# Altium footprint library Miscellaneous THD.PcbLib: 216 footprints (part 1 of 15)
Each footprint in its own frame and in the unit in brackets; x right, y up, seen from the top. Pads: shape width x height; smd on the part's side, far side on the other; paste and mask are expansions set on the pad; w line width, h text height; cw(c..) or ccw(c..) is an arc to the next point about the centre after c.
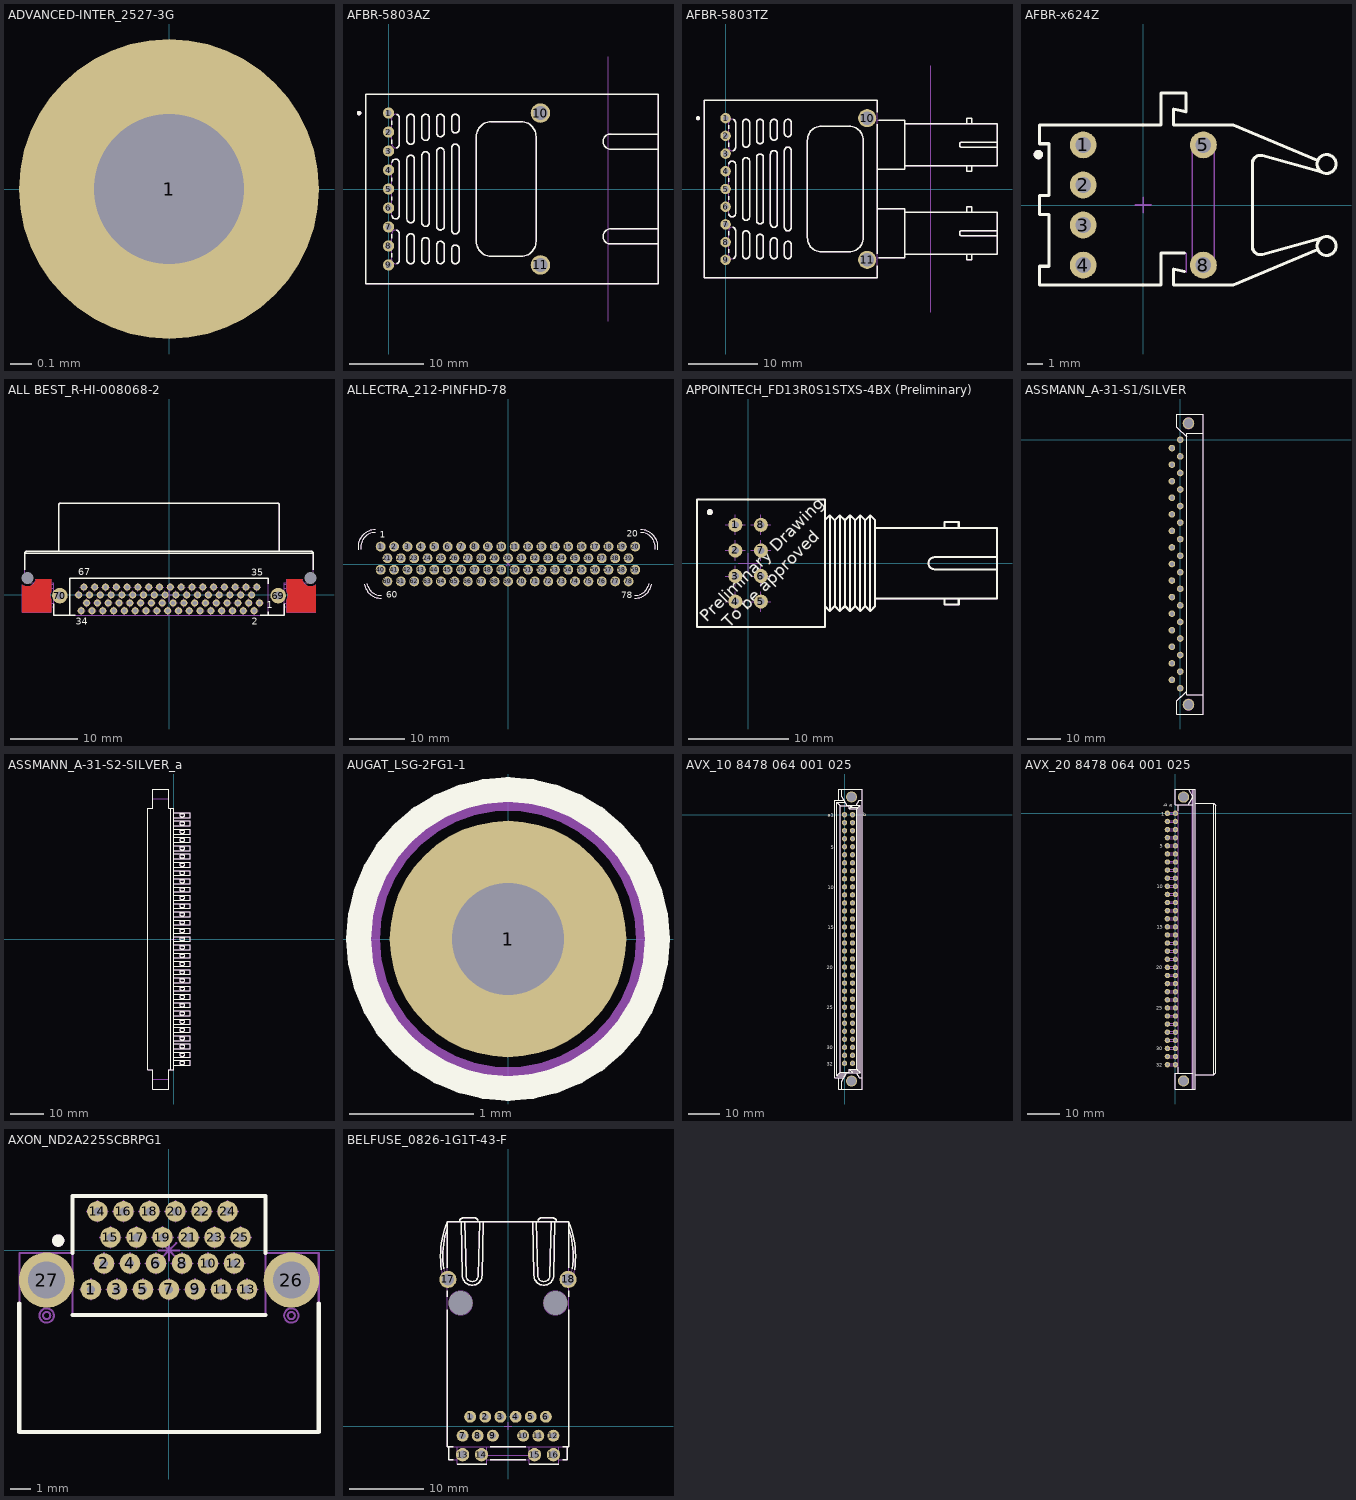
[diagram p0: the footprints below, top view; thin cyan lines are the x and y axes]

## ADVANCED-INTER_2527-3G [mm] "Single Male/Male Board Stacking Male Terminal adapter"
height 5.34
pads (1):
  round 1.4 hole 0.7: 1(0,0)
Mechanical 14:
  circle w0.1: c0,0 r0.47
  circle w0.1: c0,0 r0.23
3D body "ADVANCED-INTER_2527-2.stp": height 4.97, standoff -3.18, extent -0.47,-0.47 0.47,0.47

## AFBR-5803AZ [mm] "AFBR-5803AZ, Fiber Optic Transceiver, Through Hole Mount"
height 11.1
pads (11):
  round 1.5 hole 0.8: 1(0,10.16) 2(0,7.62) 3(0,5.08) 4(0,2.54) 5(0,0) 6(0,-2.54) 7(0,-5.08) 8(0,-7.62) 9(0,-10.16)
  round 2.6 hole 1.9: 10(20.32,10.16) 11(20.32,-10.16)
Top Overlay:
  circle w0.3: c-3.95,10.16 r0.15
  lines w0.2: 0.44,-9.152 0.44,-8.628 ; 0.44,-6.612 0.44,-6.088 ; 0.44,-1.532 0.44,-1.008 ; 0.44,1.008 0.44,1.532 ; 0.44,6.088 0.44,6.612 ; 0.44,8.628 0.44,9.152 ; 0.442,-3.547 ccw(c0.94,-3.5) 1.44,-3.5 1.44,3.5 ccw(c0.94,3.5) 0.442,3.547 ; 1.014,-5.506 cw(c0.94,-6) 1.44,-6 1.44,-9.5 cw(c0.94,-9.5) 1.085,-9.979 ; 1.014,5.506 ccw(c0.94,6) 1.44,6 1.44,9.5 ccw(c0.94,9.5) 1.085,9.979 ; 36.06,-7.35 29.77,-7.35 cw(c29.7,-6.35) 29.77,-5.35 36.06,-5.35 ; 36.06,5.35 29.77,5.35 cw(c29.7,6.35) 29.77,7.35 36.06,7.35 ; -3.06,-12.7 36.06,-12.7 36.06,12.7 -3.06,12.7 -3.06,-12.7 ; 2.44,-9.5 ccw(c2.94,-9.5) 3.44,-9.5 3.44,-6.5 ccw(c2.94,-6.5) 2.44,-6.5 2.44,-9.5 ; 2.44,-4 ccw(c2.94,-4) 3.44,-4 3.44,4 ccw(c2.94,4) 2.44,4 2.44,-4 ; 2.44,6.5 ccw(c2.94,6.5) 3.44,6.5 3.44,9.5 ccw(c2.94,9.5) 2.44,9.5 2.44,6.5 ; 4.44,-9.5 ccw(c4.94,-9.5) 5.44,-9.5 5.44,-7 ccw(c4.94,-7) 4.44,-7 4.44,-9.5 ; 4.44,-4.5 ccw(c4.94,-4.5) 5.44,-4.5 5.44,4.5 ccw(c4.94,4.5) 4.44,4.5 4.44,-4.5 ; 4.44,7 ccw(c4.94,7) 5.44,7 5.44,9.5 ccw(c4.94,9.5) 4.44,9.5 4.44,7 ; 6.44,-9.5 ccw(c6.94,-9.5) 7.44,-9.5 7.44,-7.5 ccw(c6.94,-7.5) 6.44,-7.5 6.44,-9.5 ; 6.44,-5 ccw(c6.94,-5) 7.44,-5 7.44,5 ccw(c6.94,5) 6.44,5 6.44,-5 ; 6.44,7.5 ccw(c6.94,7.5) 7.44,7.5 7.44,9.5 ccw(c6.94,9.5) 6.44,9.5 6.44,7.5 ; 8.44,-9.5 ccw(c8.94,-9.5) 9.44,-9.5 9.44,-8 ccw(c8.94,-8) 8.44,-8 8.44,-9.5 ; 8.44,-5.5 ccw(c8.94,-5.5) 9.44,-5.5 9.44,5.5 ccw(c8.94,5.5) 8.44,5.5 8.44,-5.5 ; 8.44,8 ccw(c8.94,8) 9.44,8 9.44,9.5 ccw(c8.94,9.5) 8.44,9.5 8.44,8 ; 11.74,-7 ccw(c13.74,-7) 13.74,-9 17.74,-9 ccw(c17.74,-7) 19.74,-7 19.74,7 ccw(c17.74,7) 17.74,9 13.74,9 ccw(c13.74,7) 11.74,7 11.74,-7
Mechanical 8:
  lines w0.05: -0.5,-10.16 0,-10.16 ; -0.5,-7.62 0,-7.62 ; -0.5,-5.08 0,-5.08 ; -0.5,-2.54 0,-2.54 ; -0.5,0 0,0 ; -0.5,2.54 0,2.54 ; -0.5,5.08 0,5.08 ; -0.5,7.62 0,7.62 ; -0.5,10.16 0,10.16 ; 0,-10.66 0,-10.16 ; 0,-9.66 0,-10.16 ; 0,-8.12 0,-7.62 ; 0,-7.12 0,-7.62 ; 0,-5.58 0,-5.08 ; 0,-4.58 0,-5.08 ; 0,-3.04 0,-2.54 ; 0,-2.04 0,-2.54 ; 0,-0.5 0,0 ; 0,0.5 0,0 ; 0,2.04 0,2.54 ; 0,3.04 0,2.54 ; 0,4.58 0,5.08 ; 0,5.58 0,5.08 ; 0,7.12 0,7.62 ; 0,8.12 0,7.62 ; 0,9.66 0,10.16 ; 0,10.66 0,10.16 ; 0.5,-10.16 0,-10.16 ; 0.5,-7.62 0,-7.62 ; 0.5,-5.08 0,-5.08 ; 0.5,-2.54 0,-2.54 ; 0.5,0 0,0 ; 0.5,2.54 0,2.54 ; 0.5,5.08 0,5.08 ; 0.5,7.62 0,7.62 ; 0.5,10.16 0,10.16 ; 19.82,-10.16 20.32,-10.16 ; 19.82,10.16 20.32,10.16 ; 20.32,-10.66 20.32,-10.16 ; 20.32,-9.66 20.32,-10.16 ; 20.32,9.66 20.32,10.16 ; 20.32,10.66 20.32,10.16 ; 20.82,-10.16 20.32,-10.16 ; 20.82,10.16 20.32,10.16 ; 29.41,-17.7 29.41,17.7
  text "Front Panel" at 30.021,6.184 h1.5
Mechanical 14:
  circle w0.3: c-3.95,10.16 r0.15
  lines w0.1: 36.06,-7.35 29.77,-7.35 cw(c29.7,-6.35) 29.77,-5.35 36.06,-5.35 ; 36.06,5.35 29.77,5.35 cw(c29.7,6.35) 29.77,7.35 36.06,7.35 ; -3.06,-12.7 36.06,-12.7 36.06,12.7 -3.06,12.7 -3.06,-12.7 ; 0.44,-9.5 ccw(c0.94,-9.5) 1.44,-9.5 1.44,-6 ccw(c0.94,-6) 0.44,-6 0.44,-9.5 ; 0.44,-3.5 ccw(c0.94,-3.5) 1.44,-3.5 1.44,3.5 ccw(c0.94,3.5) 0.44,3.5 0.44,-3.5 ; 0.44,6 ccw(c0.94,6) 1.44,6 1.44,9.5 ccw(c0.94,9.5) 0.44,9.5 0.44,6 ; 2.44,-9.5 ccw(c2.94,-9.5) 3.44,-9.5 3.44,-6.5 ccw(c2.94,-6.5) 2.44,-6.5 2.44,-9.5 ; 2.44,-4 ccw(c2.94,-4) 3.44,-4 3.44,4 ccw(c2.94,4) 2.44,4 2.44,-4 ; 2.44,6.5 ccw(c2.94,6.5) 3.44,6.5 3.44,9.5 ccw(c2.94,9.5) 2.44,9.5 2.44,6.5 ; 4.44,-9.5 ccw(c4.94,-9.5) 5.44,-9.5 5.44,-7 ccw(c4.94,-7) 4.44,-7 4.44,-9.5 ; 4.44,-4.5 ccw(c4.94,-4.5) 5.44,-4.5 5.44,4.5 ccw(c4.94,4.5) 4.44,4.5 4.44,-4.5 ; 4.44,7 ccw(c4.94,7) 5.44,7 5.44,9.5 ccw(c4.94,9.5) 4.44,9.5 4.44,7 ; 6.44,-9.5 ccw(c6.94,-9.5) 7.44,-9.5 7.44,-7.5 ccw(c6.94,-7.5) 6.44,-7.5 6.44,-9.5 ; 6.44,-5 ccw(c6.94,-5) 7.44,-5 7.44,5 ccw(c6.94,5) 6.44,5 6.44,-5 ; 6.44,7.5 ccw(c6.94,7.5) 7.44,7.5 7.44,9.5 ccw(c6.94,9.5) 6.44,9.5 6.44,7.5 ; 8.44,-9.5 ccw(c8.94,-9.5) 9.44,-9.5 9.44,-8 ccw(c8.94,-8) 8.44,-8 8.44,-9.5 ; 8.44,-5.5 ccw(c8.94,-5.5) 9.44,-5.5 9.44,5.5 ccw(c8.94,5.5) 8.44,5.5 8.44,-5.5 ; 8.44,8 ccw(c8.94,8) 9.44,8 9.44,9.5 ccw(c8.94,9.5) 8.44,9.5 8.44,8 ; 11.74,-7 ccw(c13.74,-7) 13.74,-9 17.74,-9 ccw(c17.74,-7) 19.74,-7 19.74,7 ccw(c17.74,7) 17.74,9 13.74,9 ccw(c13.74,7) 11.74,7 11.74,-7
3D body "AFBR-5803AZ.stp": height 11.35, standoff -3.6, extent -3.06,-12.7 36.06,12.7

## AFBR-5803TZ [mm] "AFBR-5803TZ, Fiber Optic Transceiver, Through Hole Mount"
height 12
pads (11):
  round 1.5 hole 0.8: 1(0,10.16) 2(0,7.62) 3(0,5.08) 4(0,2.54) 5(0,0) 6(0,-2.54) 7(0,-5.08) 8(0,-7.62) 9(0,-10.16)
  round 2.6 hole 1.9: 10(20.32,10.16) 11(20.32,-10.16)
Top Overlay:
  circle w0.3: c-3.95,10.16 r0.15
  lines w0.2: 0.44,-9.152 0.44,-8.628 ; 0.44,-6.612 0.44,-6.088 ; 0.44,-1.532 0.44,-1.008 ; 0.44,1.008 0.44,1.532 ; 0.44,6.088 0.44,6.612 ; 0.44,8.628 0.44,9.152 ; 0.442,-3.547 ccw(c0.94,-3.5) 1.44,-3.5 1.44,3.5 ccw(c0.94,3.5) 0.442,3.547 ; 1.014,-5.506 cw(c0.94,-6) 1.44,-6 1.44,-9.5 cw(c0.94,-9.5) 1.085,-9.979 ; 1.014,5.506 ccw(c0.94,6) 1.44,6 1.44,9.5 ccw(c0.94,9.5) 1.085,9.979 ; 21.74,-11 21.74,-12.7 -3.06,-12.7 -3.06,12.7 21.74,12.7 21.74,11 ; 21.74,-9.32 21.74,9.32 ; 21.74,-2.85 25.74,-2.85 25.74,-9.85 21.941,-9.85 ; 21.74,2.85 25.74,2.85 25.74,9.85 21.941,9.85 ; 25.74,-9.35 38.94,-9.35 38.94,-3.35 25.74,-3.35 ; 25.74,3.35 38.94,3.35 38.94,9.35 25.74,9.35 ; 34.565,-9.35 34.565,-10.16 35.315,-10.16 35.315,-9.35 ; 34.565,-3.35 34.565,-2.54 35.315,-2.54 35.315,-3.35 ; 34.565,3.35 34.565,2.54 35.315,2.54 35.315,3.35 ; 34.565,9.35 34.565,10.16 35.315,10.16 35.315,9.35 ; 38.94,-6.725 33.94,-6.725 cw(c33.94,-6.35) 33.94,-5.975 38.94,-5.975 ; 38.94,5.975 33.94,5.975 cw(c33.94,6.35) 33.94,6.725 38.94,6.725 ; 2.44,-9.5 ccw(c2.94,-9.5) 3.44,-9.5 3.44,-6.5 ccw(c2.94,-6.5) 2.44,-6.5 2.44,-9.5 ; 2.44,-4 ccw(c2.94,-4) 3.44,-4 3.44,4 ccw(c2.94,4) 2.44,4 2.44,-4 ; 2.44,6.5 ccw(c2.94,6.5) 3.44,6.5 3.44,9.5 ccw(c2.94,9.5) 2.44,9.5 2.44,6.5 ; 4.44,-9.5 ccw(c4.94,-9.5) 5.44,-9.5 5.44,-7 ccw(c4.94,-7) 4.44,-7 4.44,-9.5 ; 4.44,-4.5 ccw(c4.94,-4.5) 5.44,-4.5 5.44,4.5 ccw(c4.94,4.5) 4.44,4.5 4.44,-4.5 ; 4.44,7 ccw(c4.94,7) 5.44,7 5.44,9.5 ccw(c4.94,9.5) 4.44,9.5 4.44,7 ; 6.44,-9.5 ccw(c6.94,-9.5) 7.44,-9.5 7.44,-7.5 ccw(c6.94,-7.5) 6.44,-7.5 6.44,-9.5 ; 6.44,-5 ccw(c6.94,-5) 7.44,-5 7.44,5 ccw(c6.94,5) 6.44,5 6.44,-5 ; 6.44,7.5 ccw(c6.94,7.5) 7.44,7.5 7.44,9.5 ccw(c6.94,9.5) 6.44,9.5 6.44,7.5 ; 8.44,-9.5 ccw(c8.94,-9.5) 9.44,-9.5 9.44,-8 ccw(c8.94,-8) 8.44,-8 8.44,-9.5 ; 8.44,-5.5 ccw(c8.94,-5.5) 9.44,-5.5 9.44,5.5 ccw(c8.94,5.5) 8.44,5.5 8.44,-5.5 ; 8.44,8 ccw(c8.94,8) 9.44,8 9.44,9.5 ccw(c8.94,9.5) 8.44,9.5 8.44,8 ; 11.74,-7 ccw(c13.74,-7) 13.74,-9 17.74,-9 ccw(c17.74,-7) 19.74,-7 19.74,7 ccw(c17.74,7) 17.74,9 13.74,9 ccw(c13.74,7) 11.74,7 11.74,-7
Mechanical 8:
  lines w0.05: -0.5,-10.16 0,-10.16 ; -0.5,-7.62 0,-7.62 ; -0.5,-5.08 0,-5.08 ; -0.5,-2.54 0,-2.54 ; -0.5,0 0,0 ; -0.5,2.54 0,2.54 ; -0.5,5.08 0,5.08 ; -0.5,7.62 0,7.62 ; -0.5,10.16 0,10.16 ; 0,-10.66 0,-10.16 ; 0,-9.66 0,-10.16 ; 0,-8.12 0,-7.62 ; 0,-7.12 0,-7.62 ; 0,-5.58 0,-5.08 ; 0,-4.58 0,-5.08 ; 0,-3.04 0,-2.54 ; 0,-2.04 0,-2.54 ; 0,-0.5 0,0 ; 0,0.5 0,0 ; 0,2.04 0,2.54 ; 0,3.04 0,2.54 ; 0,4.58 0,5.08 ; 0,5.58 0,5.08 ; 0,7.12 0,7.62 ; 0,8.12 0,7.62 ; 0,9.66 0,10.16 ; 0,10.66 0,10.16 ; 0.5,-10.16 0,-10.16 ; 0.5,-7.62 0,-7.62 ; 0.5,-5.08 0,-5.08 ; 0.5,-2.54 0,-2.54 ; 0.5,0 0,0 ; 0.5,2.54 0,2.54 ; 0.5,5.08 0,5.08 ; 0.5,7.62 0,7.62 ; 0.5,10.16 0,10.16 ; 19.82,-10.16 20.32,-10.16 ; 19.82,10.16 20.32,10.16 ; 20.32,-10.66 20.32,-10.16 ; 20.32,-9.66 20.32,-10.16 ; 20.32,9.66 20.32,10.16 ; 20.32,10.66 20.32,10.16 ; 20.82,-10.16 20.32,-10.16 ; 20.82,10.16 20.32,10.16 ; 29.41,-17.7 29.41,17.7
  text "Front Panel" at 30.021,6.184 h1.5
Mechanical 14:
  circle w0.3: c-3.95,10.16 r0.15
  lines w0.1: 21.74,-9.85 25.74,-9.85 25.74,-2.85 21.74,-2.85 ; 21.74,2.85 25.74,2.85 25.74,9.85 21.74,9.85 ; 25.74,-9.35 38.94,-9.35 38.94,-3.35 25.74,-3.35 ; 25.74,3.35 38.94,3.35 38.94,9.35 25.74,9.35 ; 34.565,-9.35 34.565,-10.16 35.315,-10.16 35.315,-9.35 ; 34.565,-3.35 34.565,-2.54 35.315,-2.54 35.315,-3.35 ; 34.565,3.35 34.565,2.54 35.315,2.54 35.315,3.35 ; 34.565,9.35 34.565,10.16 35.315,10.16 35.315,9.35 ; 38.94,-6.725 33.94,-6.725 cw(c33.94,-6.35) 33.94,-5.975 38.94,-5.975 ; 38.94,5.975 33.94,5.975 cw(c33.94,6.35) 33.94,6.725 38.94,6.725 ; -3.06,-12.7 -3.06,12.7 21.74,12.7 21.74,-12.7 -3.06,-12.7 ; 0.44,-9.5 ccw(c0.94,-9.5) 1.44,-9.5 1.44,-6 ccw(c0.94,-6) 0.44,-6 0.44,-9.5 ; 0.44,-3.5 ccw(c0.94,-3.5) 1.44,-3.5 1.44,3.5 ccw(c0.94,3.5) 0.44,3.5 0.44,-3.5 ; 0.44,6 ccw(c0.94,6) 1.44,6 1.44,9.5 ccw(c0.94,9.5) 0.44,9.5 0.44,6 ; 2.44,-9.5 ccw(c2.94,-9.5) 3.44,-9.5 3.44,-6.5 ccw(c2.94,-6.5) 2.44,-6.5 2.44,-9.5 ; 2.44,-4 ccw(c2.94,-4) 3.44,-4 3.44,4 ccw(c2.94,4) 2.44,4 2.44,-4 ; 2.44,6.5 ccw(c2.94,6.5) 3.44,6.5 3.44,9.5 ccw(c2.94,9.5) 2.44,9.5 2.44,6.5 ; 4.44,-9.5 ccw(c4.94,-9.5) 5.44,-9.5 5.44,-7 ccw(c4.94,-7) 4.44,-7 4.44,-9.5 ; 4.44,-4.5 ccw(c4.94,-4.5) 5.44,-4.5 5.44,4.5 ccw(c4.94,4.5) 4.44,4.5 4.44,-4.5 ; 4.44,7 ccw(c4.94,7) 5.44,7 5.44,9.5 ccw(c4.94,9.5) 4.44,9.5 4.44,7 ; 6.44,-9.5 ccw(c6.94,-9.5) 7.44,-9.5 7.44,-7.5 ccw(c6.94,-7.5) 6.44,-7.5 6.44,-9.5 ; 6.44,-5 ccw(c6.94,-5) 7.44,-5 7.44,5 ccw(c6.94,5) 6.44,5 6.44,-5 ; 6.44,7.5 ccw(c6.94,7.5) 7.44,7.5 7.44,9.5 ccw(c6.94,9.5) 6.44,9.5 6.44,7.5 ; 8.44,-9.5 ccw(c8.94,-9.5) 9.44,-9.5 9.44,-8 ccw(c8.94,-8) 8.44,-8 8.44,-9.5 ; 8.44,-5.5 ccw(c8.94,-5.5) 9.44,-5.5 9.44,5.5 ccw(c8.94,5.5) 8.44,5.5 8.44,-5.5 ; 8.44,8 ccw(c8.94,8) 9.44,8 9.44,9.5 ccw(c8.94,9.5) 8.44,9.5 8.44,8 ; 11.74,-7 ccw(c13.74,-7) 13.74,-9 17.74,-9 ccw(c17.74,-7) 19.74,-7 19.74,7 ccw(c17.74,7) 17.74,9 13.74,9 ccw(c13.74,7) 11.74,7 11.74,-7
3D body "AFBR-5803TZ.stp": height 12.25, standoff -3.6, extent -3.06,-12.7 38.94,12.7

## AFBR-x624Z [mm] "AFBR-x624Z, Fiber Optic Receiver, Through Hole Mount"
height 7.62
pads (6):
  round 1.7 hole 1: 1(-3.81,3.81) 2(-3.81,1.27) 3(-3.81,-1.27) 4(-3.81,-3.81) 5(3.81,3.81) 8(3.81,-3.81)
Top Overlay:
  circle w0.3: c-6.65,3.2 r0.15
  circle w0.2: c11.62,2.6 r0.6
  circle w0.2: c11.62,-2.6 r0.6
  lines w0.2: 2.6,-4.222 1.92,-4.065 1.92,-5.08 5.72,-5.08 11.067,-2.833 cw(c11.62,-2.6) 11.311,-2.086 7.554,-3.129 cw(c7.42,-2.647) 6.923,-2.7 6.923,2.7 cw(c7.42,2.647) 7.554,3.129 11.311,2.086 cw(c11.62,2.6) 11.067,2.833 5.72,5.08 1.92,5.08 1.92,6.095 2.72,5.91 2.72,7.11 1.12,7.11 1.12,5.08 -6.58,5.08 -6.58,3.88 -5.98,3.88 -5.98,0.6 -6.58,0.6 -6.58,-0.6 -5.98,-0.6 -5.98,-3.88 -6.58,-3.88 -6.58,-5.08 1.12,-5.08 1.12,-3.05 2.6,-3.05
Mechanical 8:
  lines w0.1: -4.31,-3.81 -3.81,-3.81 ; -4.31,-1.27 -3.81,-1.27 ; -4.31,1.27 -3.81,1.27 ; -4.31,3.81 -3.81,3.81 ; -3.81,-4.31 -3.81,-3.81 ; -3.81,-3.31 -3.81,-3.81 ; -3.81,-1.77 -3.81,-1.27 ; -3.81,-0.77 -3.81,-1.27 ; -3.81,0.77 -3.81,1.27 ; -3.81,1.77 -3.81,1.27 ; -3.81,3.31 -3.81,3.81 ; -3.81,4.31 -3.81,3.81 ; -3.31,-3.81 -3.81,-3.81 ; -3.31,-1.27 -3.81,-1.27 ; -3.31,1.27 -3.81,1.27 ; -3.31,3.81 -3.81,3.81 ; -0.5,0 0,0 ; 0,-0.5 0,0 ; 0,0.5 0,0 ; 0.5,0 0,0 ; 3.31,-3.81 3.81,-3.81 ; 3.31,3.81 3.81,3.81 ; 3.81,-4.31 3.81,-3.81 ; 3.81,-3.31 3.81,-3.81 ; 3.81,3.31 3.81,3.81 ; 3.81,4.31 3.81,3.81 ; 4.31,-3.81 3.81,-3.81 ; 4.31,3.81 3.81,3.81
Mechanical 14:
  circle w0.3: c-6.65,3.2 r0.15
  circle w0.1: c11.62,-2.6 r0.6
  circle w0.1: c11.62,2.6 r0.6
  lines w0.1: -6.58,-5.08 1.12,-5.08 1.12,-3.05 2.72,-3.05 2.72,-4.25 1.92,-4.065 1.92,-5.08 5.72,-5.08 11.067,-2.833 cw(c11.62,-2.6) 11.311,-2.086 7.554,-3.129 cw(c7.42,-2.647) 6.923,-2.7 6.923,2.7 cw(c7.42,2.647) 7.554,3.129 11.311,2.086 cw(c11.62,2.6) 11.067,2.833 5.72,5.08 1.92,5.08 1.92,6.095 2.72,5.91 2.72,7.11 1.12,7.11 1.12,5.08 -6.58,5.08 -6.58,3.88 -5.98,3.88 -5.98,0.6 -6.58,0.6 -6.58,-0.6 -5.98,-0.6 -5.98,-3.88 -6.58,-3.88 -6.58,-5.08 ; 3.11,-3.81 ccw(c3.81,-3.81) 4.51,-3.81 4.51,3.81 ccw(c3.81,3.81) 3.11,3.81 3.11,-3.81
3D body "AFBR-x624Z.stp": height 7.66, standoff -4, extent -6.58,-5.08 12.22,7.11

## ALL BEST_R-HI-008068-2 [mm] "68 Positions, Pitch 0.8mm, Very Hight Density Right Angle Plug, VHDCI Standard"
height 6
pads (72):
  round 1.05 hole 0.65: 1(13.4,-1.2) 2(12.6,-2.35) 3(11.8,-1.2) 4(11,-2.35) 5(10.2,-1.2) 6(9.4,-2.35) 7(8.6,-1.2) 8(7.8,-2.35) 9(7,-1.2) 10(6.2,-2.35) 11(5.4,-1.2) 12(4.6,-2.35) 13(3.8,-1.2) 14(3,-2.35) 15(2.2,-1.2) 16(1.4,-2.35) 17(0.6,-1.2) 18(-0.2,-2.35) 19(-1,-1.2) 20(-1.8,-2.35) 21(-2.6,-1.2) 22(-3.4,-2.35) 23(-4.2,-1.2) 24(-5,-2.35) 25(-5.8,-1.2) 26(-6.6,-2.35) 27(-7.4,-1.2) 28(-8.2,-2.35) 29(-9,-1.2) 30(-9.8,-2.35) 31(-10.6,-1.2) 32(-11.4,-2.35) 33(-12.2,-1.2) 34(-13,-2.35) 35(13,1.15) 36(12.225,0) 37(11.4,1.15) 38(10.625,0) 39(9.8,1.15) 40(9.025,0) 41(8.2,1.15) 42(7.425,0) 43(6.6,1.15) 44(5.825,0) 45(5,1.15) 46(4.225,0) 47(3.4,1.15) 48(2.625,0) 49(1.8,1.15) 50(1.025,0) 51(0.2,1.15) 52(-0.575,0) 53(-1.4,1.15) 54(-2.175,0) 55(-3,1.15) 56(-3.775,0) 57(-4.6,1.15) 58(-5.375,0) 59(-6.2,1.15) 60(-6.975,0) 61(-7.8,1.15) 62(-8.575,0) 63(-9.4,1.15) 64(-10.175,0) 65(-11,1.15) 66(-11.775,0) 67(-12.6,1.15) 68(-13.375,0)
  round 2.3 hole 1.2: 69(16.17,-0.105) 70(-16.17,-0.105)
  round 1 hole 1.8 unplated mask+0.4: 71(20.95,2.51) 72(-20.95,2.51)
Top Layer:
  region: -17.42,-2.557 -17.42,-0.757 -17.489,-0.603 -17.57,-0.274 -17.57,0.064 -17.489,0.393 -17.42,0.547 -17.42,2.347 -19.701,2.347 -19.733,2.185 -19.858,1.881 -20.059,1.619 -20.321,1.419 -20.625,1.293 -20.952,1.25 -21.279,1.294 -21.583,1.421 -21.72,1.513 -21.72,-2.557
  region: 17.42,-2.557 17.42,-0.757 17.489,-0.603 17.57,-0.274 17.57,0.064 17.489,0.393 17.42,0.547 17.42,2.347 19.701,2.347 19.733,2.185 19.858,1.881 20.059,1.619 20.321,1.419 20.625,1.293 20.952,1.25 21.279,1.294 21.583,1.421 21.72,1.513 21.72,-2.557
Top Overlay:
  lines w0.2: -21.35,6.144 21.35,6.144 ; -21.349,3.705 -21.348,6.144 cw(c-21.048,6.144) -21.048,6.444 21.05,6.444 cw(c21.05,6.144) 21.35,6.144 ; -17.1,-1.314 -17.1,-3.005 -13.875,-3.005 ; -16.347,6.444 -16.347,13.294 cw(c-16.047,13.294) -16.047,13.594 16.049,13.594 cw(c16.049,13.294) 16.349,13.294 16.349,6.444 ; -14.7,-3.005 -14.7,2.435 14.7,2.435 14.7,1.625 ; 13.5,-3.005 17.1,-3.005 ; 14.7,-3.005 14.7,-2.5 ; 15.555,-3.005 17.1,-3.005 ; 17.1,-1.314 17.1,-3.005 ; 21.35,3.705 21.35,6.144
  text "1" at 14.496,-1.974 h1
  text "35" at 12.2,2.862 h1
  text "67" at -13.464,2.936 h1
  text "34" at -13.8,-4.446 h1
  text "2" at 12.275,-4.446 h1
Top Solder:
  region: 17.293,-2.684 21.847,-2.684 21.847,1.818 21.772,1.73 21.596,1.579 21.394,1.468 21.173,1.399 20.943,1.377 20.713,1.402 20.493,1.473 20.292,1.588 20.119,1.74 19.98,1.925 19.881,2.134 19.827,2.359 19.818,2.474 17.293,2.474 17.293,0.515 17.362,0.369 17.443,0.056 17.443,-0.266 17.362,-0.579 17.293,-0.725
  region: -21.847,-2.684 -17.293,-2.684 -17.293,-0.725 -17.362,-0.579 -17.443,-0.266 -17.443,0.056 -17.362,0.369 -17.293,0.515 -17.293,2.474 -19.818,2.474 -19.827,2.359 -19.881,2.134 -19.98,1.925 -20.119,1.74 -20.292,1.588 -20.493,1.473 -20.713,1.402 -20.943,1.377 -21.173,1.399 -21.394,1.468 -21.596,1.579 -21.772,1.73 -21.847,1.818
Mechanical 8:
  drawing of 614 lines, arcs and shapes, not listed
Mechanical 14:
  lines w0.1: -21.35,6.144 21.35,6.144 ; -17.1,-1.755 -19.275,-1.755 cw(c-19.275,-1.255) -19.775,-1.255 -19.775,1.045 cw(c-19.275,1.045) -19.275,1.545 -17.1,1.545 ; -17.1,-1.205 -19.075,-1.205 cw(c-19.075,-1.005) -19.275,-1.005 -19.275,0.795 cw(c-19.075,0.795) -19.075,0.995 -17.1,0.995 ; -16.347,6.444 -16.347,13.294 cw(c-16.047,13.294) -16.047,13.594 16.049,13.594 cw(c16.049,13.294) 16.349,13.294 16.349,6.444 ; -14.7,-3.005 -14.7,2.435 14.7,2.435 14.7,-3.005 17.1,-3.005 ; 17.1,-1.755 19.275,-1.755 ccw(c19.275,-1.255) 19.775,-1.255 19.775,1.045 ccw(c19.275,1.045) 19.275,1.545 17.1,1.545 ; 17.1,-1.205 19.075,-1.205 ccw(c19.075,-1.005) 19.275,-1.005 19.275,0.795 ccw(c19.075,0.795) 19.075,0.995 17.1,0.995 ; 17.1,-3.005 -17.1,-3.005 -17.1,1.81 -21.35,1.81 -21.348,6.144 cw(c-21.048,6.144) -21.048,6.444 21.05,6.444 cw(c21.05,6.144) 21.35,6.144 ; 17.1,-3.005 17.1,1.81 21.35,1.81 21.35,6.144
  text "1" at 14.496,-1.974 h1
  text "35" at 12.2,2.862 h1
  text "67" at -13.464,2.936 h1
  text "34" at -13.8,-4.446 h1
  text "2" at 12.275,-4.446 h1
3D body "ALL BEST_R-HI-008068-2.stp": height 6, standoff -3.7, extent -21.35,-3.005 21.35,13.594

## ALLECTRA_212-PINFHD-78 [mm] "78 Crimp Pins for High Desnity 78 Pins Sub-D Female Connector"
height 7.31
pads (78):
  round 1.78 / inner round 1.78 / far side round 2.05 hole 1.25: 1(-22.9,3.12) 2(-20.49,3.12) 3(-18.08,3.12) 4(-15.67,3.12) 5(-13.26,3.12) 6(-10.85,3.12) 7(-8.44,3.12) 8(-6.03,3.12) 9(-3.62,3.12) 10(-1.21,3.12) 11(1.2,3.12) 12(3.61,3.12) 13(6.02,3.12) 14(8.43,3.12) 15(10.84,3.12) 16(13.25,3.12) 17(15.66,3.12) 18(18.07,3.12) 19(20.48,3.12) 20(22.89,3.12) 21(-21.69,1.04) 22(-19.28,1.04) 23(-16.87,1.04) 24(-14.46,1.04) 25(-12.05,1.04) 26(-9.64,1.04) 27(-7.23,1.04) 28(-4.82,1.04) 29(-2.41,1.04) 30(0,1.04) 31(2.41,1.04) 32(4.82,1.04) 33(7.23,1.04) 34(9.64,1.04) 35(12.05,1.04) 36(14.46,1.04) 37(16.87,1.04) 38(19.28,1.04) 39(21.69,1.04) 40(-22.9,-1.04) 41(-20.49,-1.04) 42(-18.08,-1.04) 43(-15.67,-1.04) 44(-13.26,-1.04) 45(-10.85,-1.04) 46(-8.44,-1.04) 47(-6.03,-1.04) 48(-3.62,-1.04) 49(-1.21,-1.04) 50(1.2,-1.04) 51(3.61,-1.04) 52(6.02,-1.04) 53(8.43,-1.04) 54(10.84,-1.04) 55(13.25,-1.04) 56(15.66,-1.04) 57(18.07,-1.04) 58(20.48,-1.04) 59(22.89,-1.04) 60(-21.69,-3.12) 61(-19.28,-3.12) 62(-16.87,-3.12) 63(-14.46,-3.12) 64(-12.05,-3.12) 65(-9.64,-3.12) 66(-7.23,-3.12) 67(-4.82,-3.12) 68(-2.41,-3.12) 69(0,-3.12) 70(2.41,-3.12) 71(4.82,-3.12) 72(7.23,-3.12) 73(9.64,-3.12) 74(12.05,-3.12) 75(14.46,-3.12) 76(16.87,-3.12) 77(19.28,-3.12) 78(21.69,-3.12)
Top Overlay:
  lines w0.2: -26.933,2.522 cw(c-23.88,3.06) -23.88,6.16 ; -26.441,2.609 cw(c-23.88,3.06) -23.88,5.66 ; -25.854,-3.598 ccw(c-22.801,-3.06) -22.801,-6.16 ; -25.361,-3.511 ccw(c-22.801,-3.06) -22.801,-5.66 ; 22.801,-6.16 ccw(c22.801,-3.06) 25.854,-3.598 ; 22.801,-5.66 ccw(c22.801,-3.06) 25.361,-3.511 ; 23.88,5.66 cw(c23.88,3.06) 26.441,2.609 ; 23.88,6.16 cw(c23.88,3.06) 26.933,2.522
  text "20" at 21.386,4.896 h1.2
  text "78" at 20.346,-6.139 h1.2
  text "1" at -23.032,4.764 h1.2
  text "60" at -21.907,-6.032 h1.2
Mechanical 8:
  drawing of 316 lines, arcs and shapes, not listed
  text "pin female orgenized as male pinout" at -20.14,4.764 h1.2
Mechanical 14:
  circle w0.1: c-22.9,3.12 r0.35
  circle w0.1: c-21.69,1.04 r0.35
  circle w0.1: c-22.9,-1.04 r0.35
  circle w0.1: c-21.69,-3.12 r0.35
  circle w0.1: c-20.49,3.12 r0.35
  circle w0.1: c-19.28,1.04 r0.35
  circle w0.1: c-20.49,-1.04 r0.35
  circle w0.1: c-19.28,-3.12 r0.35
  circle w0.1: c-18.08,3.12 r0.35
  circle w0.1: c-16.87,1.04 r0.35
  circle w0.1: c-18.08,-1.04 r0.35
  circle w0.1: c-16.87,-3.12 r0.35
  circle w0.1: c-15.67,3.12 r0.35
  circle w0.1: c-14.46,1.04 r0.35
  circle w0.1: c-15.67,-1.04 r0.35
  circle w0.1: c-14.46,-3.12 r0.35
  circle w0.1: c-13.26,3.12 r0.35
  circle w0.1: c-12.05,1.04 r0.35
  circle w0.1: c-13.26,-1.04 r0.35
  circle w0.1: c-12.05,-3.12 r0.35
  circle w0.1: c-10.85,3.12 r0.35
  circle w0.1: c-9.64,1.04 r0.35
  circle w0.1: c-10.85,-1.04 r0.35
  circle w0.1: c-9.64,-3.12 r0.35
  circle w0.1: c-8.44,3.12 r0.35
  circle w0.1: c-7.23,1.04 r0.35
  circle w0.1: c-8.44,-1.04 r0.35
  circle w0.1: c-7.23,-3.12 r0.35
  circle w0.1: c-6.03,3.12 r0.35
  circle w0.1: c-4.82,1.04 r0.35
  circle w0.1: c-6.03,-1.04 r0.35
  circle w0.1: c-4.82,-3.12 r0.35
  circle w0.1: c-3.62,3.12 r0.35
  circle w0.1: c-2.41,1.04 r0.35
  circle w0.1: c-3.62,-1.04 r0.35
  circle w0.1: c-2.41,-3.12 r0.35
  circle w0.1: c-1.21,3.12 r0.35
  circle w0.1: c0,1.04 r0.35
  circle w0.1: c-1.21,-1.04 r0.35
  circle w0.1: c0,-3.12 r0.35
  circle w0.1: c1.2,3.12 r0.35
  circle w0.1: c2.41,1.04 r0.35
  circle w0.1: c1.2,-1.04 r0.35
  circle w0.1: c2.41,-3.12 r0.35
  circle w0.1: c3.61,3.12 r0.35
  circle w0.1: c4.82,1.04 r0.35
  circle w0.1: c3.61,-1.04 r0.35
  circle w0.1: c4.82,-3.12 r0.35
  circle w0.1: c6.02,3.12 r0.35
  circle w0.1: c7.23,1.04 r0.35
  circle w0.1: c6.02,-1.04 r0.35
  circle w0.1: c7.23,-3.12 r0.35
  circle w0.1: c8.43,3.12 r0.35
  circle w0.1: c9.64,1.04 r0.35
  circle w0.1: c8.43,-1.04 r0.35
  circle w0.1: c9.64,-3.12 r0.35
  circle w0.1: c10.84,3.12 r0.35
  circle w0.1: c12.05,1.04 r0.35
  circle w0.1: c10.84,-1.04 r0.35
  circle w0.1: c12.05,-3.12 r0.35
  circle w0.1: c13.25,3.12 r0.35
  circle w0.1: c14.46,1.04 r0.35
  circle w0.1: c13.25,-1.04 r0.35
  circle w0.1: c14.46,-3.12 r0.35
  circle w0.1: c15.66,3.12 r0.35
  circle w0.1: c16.87,1.04 r0.35
  circle w0.1: c15.66,-1.04 r0.35
  circle w0.1: c16.87,-3.12 r0.35
  circle w0.1: c18.07,3.12 r0.35
  circle w0.1: c19.28,1.04 r0.35
  circle w0.1: c18.07,-1.04 r0.35
  circle w0.1: c19.28,-3.12 r0.35
  circle w0.1: c20.48,3.12 r0.35
  circle w0.1: c21.69,1.04 r0.35
  circle w0.1: c20.48,-1.04 r0.35
  circle w0.1: c21.69,-3.12 r0.35
  circle w0.1: c22.89,3.12 r0.35
  circle w0.1: c22.89,-1.04 r0.35
  lines w0.1: -26.933,2.522 cw(c-23.88,3.06) -23.88,6.16 ; -26.441,2.609 cw(c-23.88,3.06) -23.88,5.66 ; -25.854,-3.598 ccw(c-22.801,-3.06) -22.801,-6.16 ; -25.361,-3.511 ccw(c-22.801,-3.06) -22.801,-5.66 ; 22.801,-6.16 ccw(c22.801,-3.06) 25.854,-3.598 ; 22.801,-5.66 ccw(c22.801,-3.06) 25.361,-3.511 ; 23.88,5.66 cw(c23.88,3.06) 26.441,2.609 ; 23.88,6.16 cw(c23.88,3.06) 26.933,2.522
  text "20" at 21.386,4.896 h1.2
  text "78" at 20.346,-6.139 h1.2
3D body "ALLECTRA_212-PINFHD-78_3d.stp": height 7.31, standoff -5.8, extent -23.655,-3.878 23.649,3.879
